# Altium footprint library DrPCB.PcbLib: 910 footprints (part 33 of 57)
Each footprint in its own frame and in the unit in brackets; x right, y up, seen from the top. Pads: shape width x height; smd on the part's side, far side on the other; paste and mask are expansions set on the pad; w line width, h text height; cw(c..) or ccw(c..) is an arc to the next point about the centre after c.
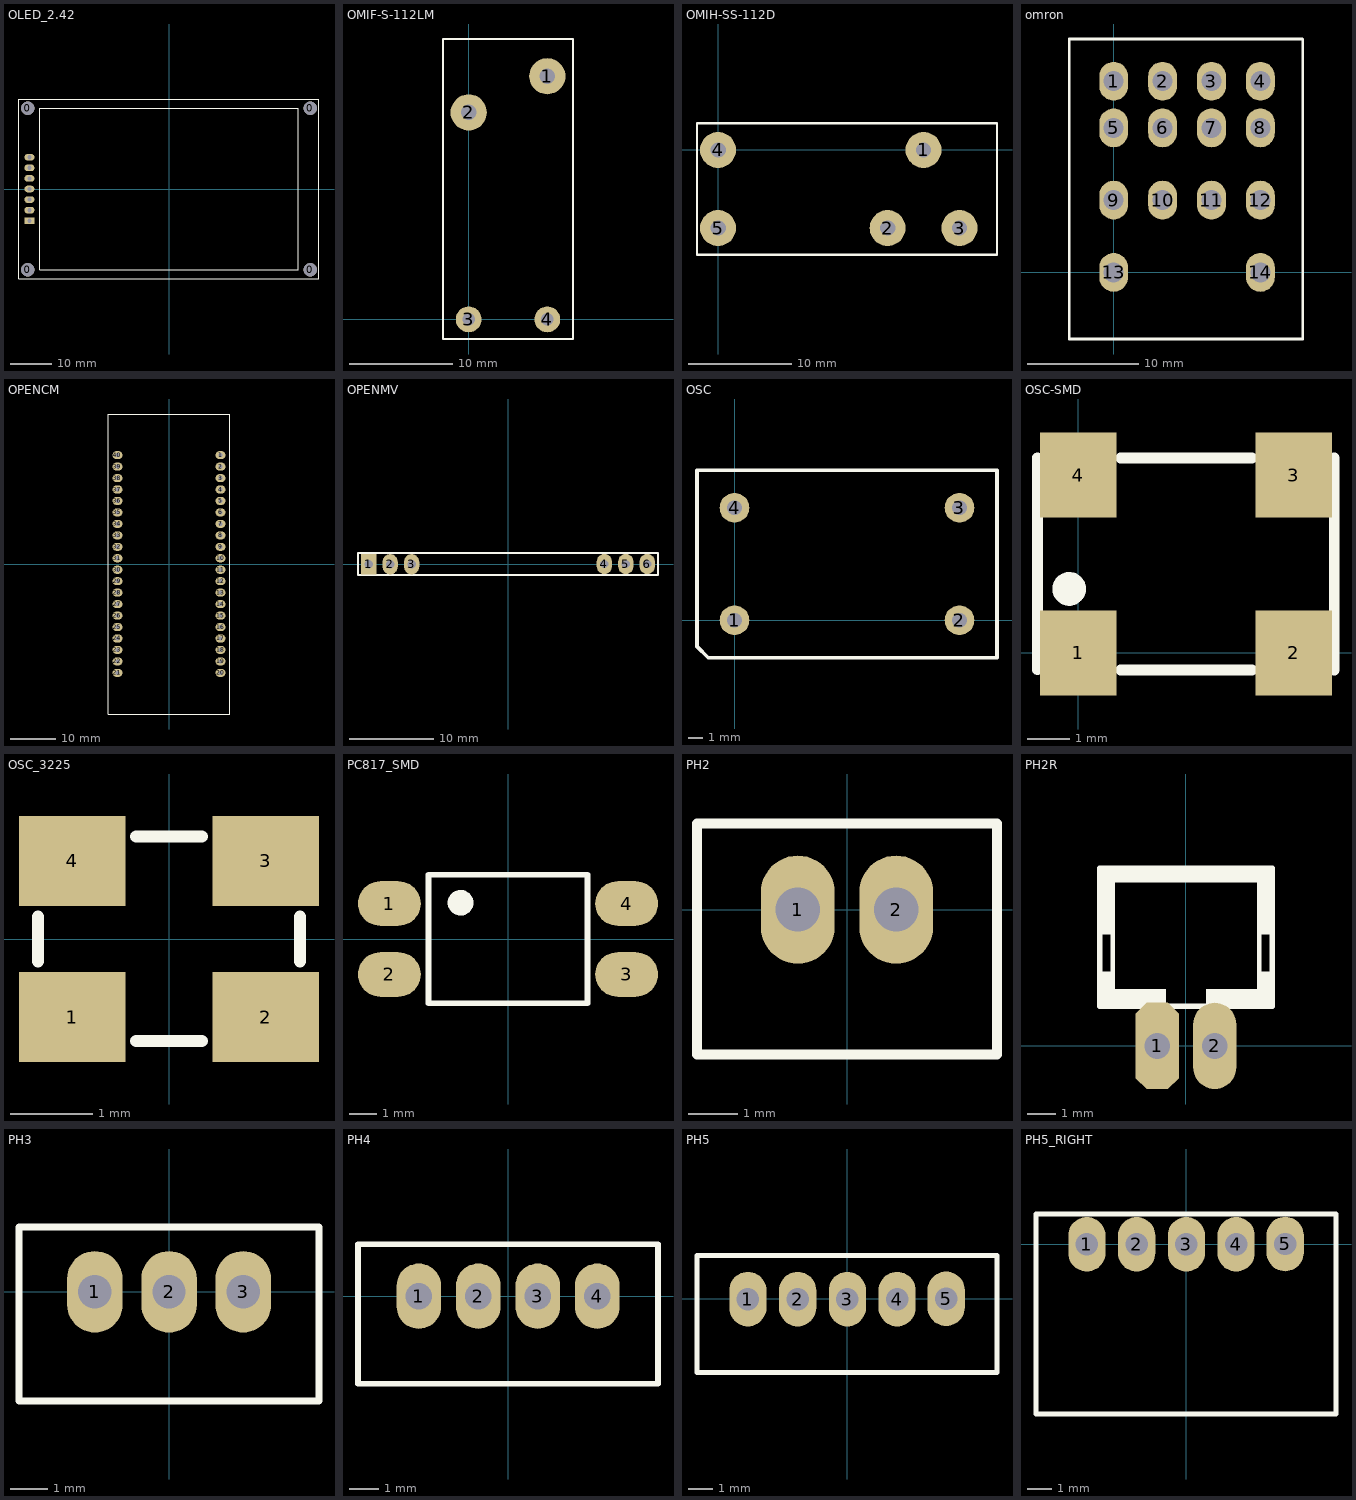
[diagram p32: the footprints below, top view; thin cyan lines are the x and y axes]

## OLED_2.42 [mm]
pads (11):
  round 3.2 hole 3.2: 0(-33.9,-19.4) 0(-33.9,19.4) 0(33.9,-19.4) 0(33.9,19.4)
  rect 2.4x1.6 hole 1: 1(-33.5,-7.62)
  oval 2.4x1.6 hole 1: 2(-33.5,-5.08) 3(-33.5,-2.54) 4(-33.5,0) 5(-33.5,2.54) 6(-33.5,5.08) 7(-33.5,7.62)
Top Overlay:
  lines w0.254: -36,-21.5 36,-21.5 36,21.5 -36,21.5 -36,-21.5 ; -31,-19.4 31,-19.4 31,19.4 -31,19.4 -31,-19.4
3D body "OLED 2.42 12864 v7.step": height 7.45, standoff -5.99, extent -36,-21.4 36,21.4

## OMIF-S-112LM [mm]
pads (4):
  round 3.5 hole 1.5: 1(7.6,23.5) 2(0,20)
  round 2.5 hole 1.2: 3(0,0) 4(7.6,0)
Top Overlay:
  lines w0.2: -2.5,-1.9 -2.5,27.1 10.1,27.1 10.1,-1.9 -2.5,-1.9
3D body: height 24.5, standoff 0, extent -2.489,-1.88 10.096,27.102
3D body: height 34, standoff 0, extent 0.768,24.246 6.839,24.754
3D body: height 34, standoff 0, extent 0.768,17.746 6.839,18.254

## OMIH-SS-112D [mm]
pads (5):
  round 3.5 hole 1.5: 1(20,0) 2(16.5,-7.6) 3(23.5,-7.6) 4(0,0) 5(0,-7.6)
Top Overlay:
  lines w0.2: -2.05,-10.2 27.15,-10.2 27.15,2.6 -2.05,2.6 -2.05,-10.2
3D body "c-8-1440000-3-d3-3d.stp": height 20.4, standoff -4.2, extent -2.05,-10.2 27.15,2.6

## omron [mm]
pads (14):
  oval 2.6x3.5 hole 1.8: 1(0,17.2) 2(4.4,17.2) 3(8.8,17.2) 4(13.2,17.2) 5(0,13) 6(4.4,13) 7(8.8,13) 8(13.2,13) 9(0,6.5) 10(4.4,6.5) 11(8.8,6.5) 12(13.2,6.5) 13(0,0) 14(13.2,0)
Top Overlay:
  lines w0.254: 16.974,-6 -4,-6 -4,21 17,21 ; 17.014,-6 17.014,20.976

## OPENCM [mm]
pads (40):
  oval 2.2x1.8 hole 0.9: 1(11.42,24.13) 2(11.42,21.59) 3(11.42,19.05) 4(11.42,16.51) 5(11.42,13.97) 6(11.42,11.43) 7(11.42,8.89) 8(11.42,6.35) 9(11.42,3.81) 10(11.42,1.27) 11(11.42,-1.27) 12(11.42,-3.81) 13(11.42,-6.35) 14(11.42,-8.89) 15(11.42,-11.43) 16(11.42,-13.97) 17(11.42,-16.51) 18(11.42,-19.05) 19(11.42,-21.59) 20(11.42,-24.13) 21(-11.42,-24.13) 22(-11.42,-21.59) 23(-11.42,-19.05) 24(-11.42,-16.51) 25(-11.42,-13.97) 26(-11.42,-11.43) 27(-11.42,-8.89) 28(-11.42,-6.35) 29(-11.42,-3.81) 30(-11.42,-1.27) 31(-11.42,1.27) 32(-11.42,3.81) 33(-11.42,6.35) 34(-11.42,8.89) 35(-11.42,11.43) 36(-11.42,13.97) 37(-11.42,16.51) 38(-11.42,19.05) 39(-11.42,21.59) 40(-11.42,24.13)
Top Overlay:
  lines w0.1: -13.5,-33.25 13.5,-33.25 13.5,33.25 -13.5,33.25 -13.5,-33.25

## OPENMV [mm]
pads (6):
  rect 1.8x2.4 hole 1: 1(-16.481,-0.015)
  oval 1.8x2.4 hole 1: 2(-13.941,-0.015) 3(-11.401,-0.015) 4(11.401,0.015) 5(13.941,0.015) 6(16.481,0.015)
Top Overlay:
  lines w0.254: -17.749,1.309 17.751,1.309 17.751,-1.279 -17.751,-1.279 -17.751,1.249 -17.717,1.283

## OSC [mm]
pads (4):
  round 2 hole 1: 1(0,0) 2(15.24,0) 3(15.24,7.62) 4(0,7.62)
Top Overlay:
  lines w0.254: -2.54,-1.778 -1.778,-2.54 17.78,-2.54 17.78,10.16 -2.54,10.16 -2.54,-1.778

## OSC-SMD [mm]
pads (4):
  rect 1.8x2 smd: 1(0,0) 2(5.08,0) 3(5.08,4.2) 4(0,4.2)
Top Overlay:
  circle w0.4: c-0.216,1.511 r0.197
  lines w0.254: -0.965,-0.394 -0.965,4.606 ; 1,-0.4 4.1,-0.4 ; 1,4.6 4.1,4.6 ; 6.04,-0.4 6.04,4.6
3D body "User Library-ECS-3951.step": height 1.71, standoff 0.01, extent -0.95,-0.395 6.05,4.607

## OSC_3225 [mm]
pads (4):
  rect 1.3x1.1 smd: 1(-1.181,-0.953) 2(1.181,-0.953) 3(1.181,0.953) 4(-1.181,0.953)
Top Overlay:
  lines w0.15: -1.6,-0.27 -1.6,0.27 ; -0.4,-1.245 0.4,-1.245 ; -0.4,1.25 0.4,1.25 ; 1.6,-0.27 1.6,0.27
3D body "User Library-ASE_series _ABRACON.step": height 1.2, standoff 0, extent -1.6,-1.25 1.6,1.25

## PC817_SMD [mm]
pads (4):
  oval 2.25x1.6 smd: 1(-4.25,1.27) 2(-4.25,-1.27) 3(4.25,-1.27) 4(4.25,1.27)
Top Overlay:
  circle w0.2: c-1.7,1.3 r0.361
  region: -1.4,1.003 -2.006,1.003 -2.006,1.6 -1.4,1.6
  lines w0.2: -2.85,-2.3 2.85,-2.3 2.85,2.3 -2.85,2.3 -2.85,-2.3
3D body "User Library-PC817_Gullwing.STEP": height 3.86, standoff 0.01, extent -5,-2.29 5,2.29

## PH2 [mm]
pads (2):
  oval 1.5x2.2 hole 0.9: 1(-1,0) 2(1,0)
Top Overlay:
  lines w0.2: -3.05,-2.946 3.05,-2.946 3.05,1.75 -3.05,1.75 -3.05,-2.946
3D body "User Library-PCB HEADER (JST BxB-PH-K-S (VERTICAL)).step": height 6.01, standoff -1.89, extent -3,-2.85 3,1.65

## PH2R [mm] "JST PH Series, pitch: 2.0mm, 2.0A/100v"
pads (2):
  oct 1.5x3 hole 0.9: 1(-1,0)
  oval 1.5x3 hole 0.9: 2(1,0)
Top Overlay:
  region: 3,2.575 2.5,2.575 2.5,1.375 3,1.375
  region: 3,1.975 0.7,1.975 0.7,1.375 3,1.375
  region: 3,6.175 2.5,6.175 2.5,3.875 3,3.875
  rectangle: -3,1.375 -2.5,2.575
  rectangle: -3,1.375 -0.7,1.975
  rectangle: -3,3.875 -2.5,6.175
  region: -3,6.175 -3,5.675 3,5.675 3,6.175
  lines w0.15: -2.55,1.375 -2.55,6.175 ; 2.55,1.375 2.55,6.175
  lines w0.2: -3,1.375 3,1.375 3,6.175 -3,6.175 -3,1.375
3D body "User Library-S2B.step": height 4.81, standoff -3.39, extent -2.934,-1.311 2.966,6.289

## PH3 [mm]
pads (3):
  oval 1.5x2.2 hole 0.9: 1(-2.003,0) 2(0,0) 3(2.003,0)
Top Overlay:
  lines w0.2: 4.026,-2.95 -4.053,-2.95 -4.053,1.75 4.05,1.75 4.05,-2.95
3D body "User Library-PCB HEADER (JST BxB-PH-K-S (VERTICAL)).step": height 6.01, standoff -1.89, extent -4.002,-2.85 3.998,1.65

## PH4 [mm]
pads (4):
  oval 1.5x2.2 hole 0.9: 1(-3.005,0) 2(-1.002,0) 3(1.002,0) 4(3.005,0)
Top Overlay:
  lines w0.2: -5.055,-2.95 5.052,-2.95 5.052,1.75 -5.055,1.75 -5.055,-2.95
3D body "User Library-PCB HEADER (JST BxB-PH-K-S (VERTICAL)) (1).step": height 6.01, standoff -1.89, extent -5.002,-2.85 4.998,1.65

## PH5 [mm]
pads (5):
  oval 1.5x2.2 hole 0.9: 1(-3.993,-0.006) 2(-1.99,-0.006) 3(0.014,-0.006) 4(2.017,-0.006) 5(3.993,0.006)
Top Overlay:
  lines w0.2: 6.04,-2.956 -6.043,-2.956 -6.043,1.744 6.04,1.744 6.04,-2.944
3D body "User Library-PCB HEADER (JST BxB-PH-K-S (VERTICAL)) (2).step": height 6.01, standoff -1.89, extent -5.986,-2.85 6.014,1.65

## PH5_RIGHT [mm]
pads (5):
  oval 1.5x2.2 hole 0.9: 1(-3.993,-0.006) 2(-1.99,-0.006) 3(0.014,-0.006) 4(2.017,-0.006) 5(3.993,0.006)
Top Overlay:
  lines w0.2: -6.043,-6.845 -6.043,1.219 6.04,1.219 6.04,-6.845 -6.043,-6.845
3D body "User Library-PCB HEADER (JST SxB-PH-K-S (RIGHT ANGLE)).step": height 4.81, standoff -1.99, extent -5.937,-6.736 5.963,0.864